# Altium footprint library 3D封装库.PcbLib: 716 footprints (part 15 of 45)
Each footprint in its own frame and in the unit in brackets; x right, y up, seen from the top. Pads: shape width x height; smd on the part's side, far side on the other; paste and mask are expansions set on the pad; w line width, h text height; cw(c..) or ccw(c..) is an arc to the next point about the centre after c.
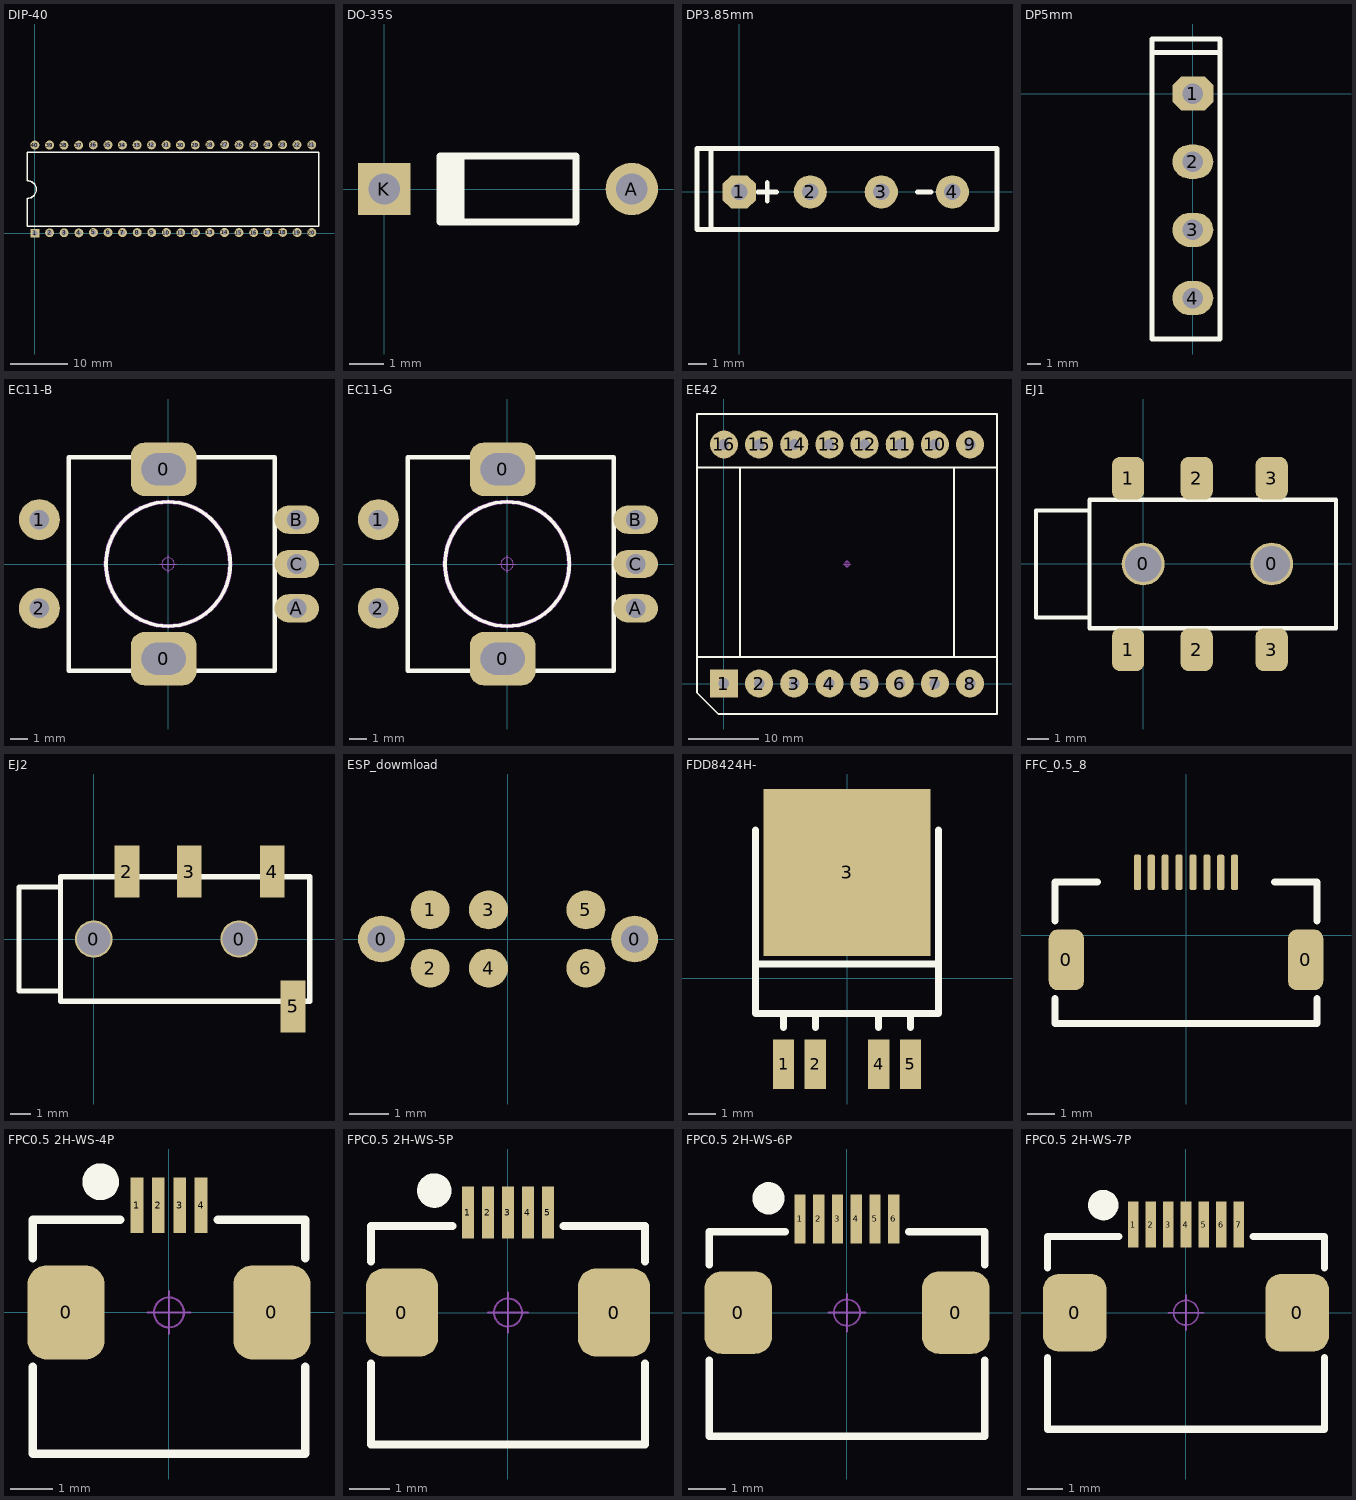
[diagram p14: the footprints below, top view; thin cyan lines are the x and y axes]

## DIP-40 [mil]
pads (40):
  rect 61x61 hole 35: 1(0,0)
  round 61 hole 35: 2(100.42,3.33) 3(199.58,3.33) 4(301.25,2.5) 5(400.83,5.42) 6(501.67,5.42) 7(600.42,4.58) 8(701.25,4.58) 9(800.83,5) 10(901.67,5) 11(1000.42,4.17) 12(1101.25,4.17) 13(1200,5.42) 14(1300.83,5.42) 15(1399.58,4.58) 16(1500.42,4.58) 17(1599.17,5.83) 18(1700,5.83) 19(1798.75,5) 20(1899.58,5) 21(1898.75,606.67) 22(1797.92,606.67) 23(1699.17,607.5) 24(1598.33,607.5) 25(1501.25,606.25) 26(1400.42,606.25) 27(1301.67,607.08) 28(1200.83,607.08) 29(1099.58,605.42) 30(998.75,605.42) 31(900,606.25) 32(799.17,606.25) 33(700.42,605.42) 34(599.58,605.42) 35(500.83,606.25) 36(400,606.25) 37(299.58,604.58) 38(198.75,604.58) 39(100,605.42) 40(-0.83,605.42)
Top Overlay:
  lines w10: -52.5,240.35 -52.5,49.58 1948.75,49.58 1948.75,557.5 -52.5,557.5 -52.5,359.6 cw(c-50,300) -50,240.35
3D body "DIP40.step": height 224.41, standoff -101.57, extent -90.1,-0.09 1974.86,609.75

## DO-35S [mm] "Diode, Axial; Body 3.8 x 1.9 mm (LxDia. max), Lead Dia. 0.53 mm (max)"
height 1.9
pads (2):
  round 1.5 hole 0.9: A(7.1,0)
  rect 1.5x1.5 hole 0.9: K(0,0)
Top Overlay:
  region: 2.3,0.95 1.5,0.95 1.5,-0.95 2.3,-0.95
  lines w0.2: 1.6,-0.95 5.5,-0.95 5.5,0.95 1.6,0.95

## DP3.85mm [mm]
pads (4):
  oct 1.8x1.8 hole 0.9: 1(0,0)
  round 1.8 hole 0.9: 2(3.85,0) 3(7.7,0) 4(11.55,0)
Top Overlay:
  lines w0.254: -1.524,-2.032 -1.524,2.348 ; 1.016,0 2.032,0 ; 1.524,-0.508 1.524,0.508 ; 9.652,0 10.414,0 ; -2.286,-2.032 13.97,-2.032 13.97,2.348 -2.286,2.348 -2.286,-2.032

## DP5mm [mm]
pads (4):
  oct 3x2.5 hole 1.5: 1(0,0)
  oval 3x2.5 hole 1.5: 2(0,-5) 3(0,-10) 4(0,-15)
Top Overlay:
  lines w0.381: -3,3 2,3 ; -3,-18 -3,4 2,4 2,-18 -3,-18

## EC11-B [mm] "数字开关编码器"
pads (7):
  rrect50% 3.7x3 hole 1.8 slot 2.5 at 0 deg: 0(-0.254,-5.334) 0(-0.254,5.334)
  round 2.3 hole 1.1: 1(-7.25,2.5) 2(-7.25,-2.5)
  oval 2.5x1.6 hole 1.1: A(7.25,-2.5) B(7.25,2.5) C(7.25,0)
Top Overlay:
  circle w0.203: c0,0 r3.5
  lines w0.254: -5.588,-6 -5.588,6 6,6 6,-6 -5.588,-6
Mechanical 15:
  circle w0.254: c0,0 r3.5
  circle w0.05: c0,0 r0.35
  lines w0.05: -0.5,0 0.5,0 ; 0,-0.5 0,0.5
3D body "CE11.STEP": height 22, standoff -3.5, extent -7.35,-6.237 7.45,6.237

## EC11-G [mm] "数字开关编码器"
pads (7):
  rrect50% 3.7x3 hole 1.8 slot 2.5 at 0 deg: 0(-0.254,-5.334) 0(-0.254,5.334)
  round 2.3 hole 1.1: 1(-7.25,2.5) 2(-7.25,-2.5)
  oval 2.5x1.6 hole 1.1: A(7.25,-2.5) B(7.25,2.5) C(7.25,0)
Top Overlay:
  circle w0.203: c0,0 r3.5
  lines w0.254: -5.588,-6 6,-6 6,6 -5.588,6 -5.588,-6
Mechanical 15:
  circle w0.05: c0,0 r0.35
  circle w0.254: c0,0 r3.5
  lines w0.05: -0.5,0 0.5,0 ; 0,-0.5 0,0.5
3D body "EC11-B.STEP": height 22, standoff -3.5, extent -7.404,-6.237 7.396,6.237

## EE42 [mm]
pads (16):
  rect 4x4 hole 1.5: 1(0,0)
  round 4 hole 1.5: 2(5,0) 3(10,0) 4(15,0) 5(20,0) 6(25,0) 7(30,0) 8(35,0) 9(35,34) 10(30,34) 11(25,34) 12(20,34) 13(15,34) 14(10,34) 15(5,34) 16(0,34)
Top Overlay:
  lines w0.254: -3.836,3.792 38.836,3.792 ; -3.836,30.716 38.836,30.716 ; 2.26,3.792 2.26,30.716 ; 32.74,3.792 32.74,30.716 ; -3.836,-1.288 -3.836,38.336 38.836,38.336 38.836,-4.336 -0.788,-4.336 -3.836,-1.288
Mechanical 15:
  circle w0.05: c17.5,17 r0.35
  lines w0.05: 17,17 18,17 ; 17.5,16.5 17.5,17.5
3D body "EE42-15 8+8.STEP": height 31.55, standoff -3.15, extent -3.6,-4.1 38.6,38.1

## EJ1 [mm]
pads (8):
  round 2 hole 1.7: 0(0,0) 0(6,0)
  rrect50% 1.5x2 smd: 1(-0.7,-4) 1(-0.7,4) 2(2.5,-4) 2(2.5,4) 3(6,-4) 3(6,4)
Top Overlay:
  lines w0.203: -2.5,-2.75 -2.5,2.75 ; -5,-2.5 -5,2.5 -2.5,2.5 -2.5,3 9,3 9,-3 -2.5,-3 -2.5,-2.5 -5,-2.5

## EJ2 [mm]
pads (6):
  round 1.8 hole 1.6: 0(0,0) 0(7,0)
  rect 1.2x2.5 smd: 2(1.6,3.25) 3(4.6,3.25) 4(8.6,3.25) 5(9.6,-3.25)
Top Overlay:
  lines w0.254: -1.6,-2.5 -3.6,-2.5 -3.6,2.5 -1.6,2.5 ; -1.6,-3 10.4,-3 10.4,3 -1.6,3 -1.6,-3

## ESP_dowmload [mm] "下载接口"
pads (8):
  round 1.2 hole 0.7 mask+0.05: 0(-3.25,0) 0(3.25,0)
  round 1 smd paste-1 mask+0.05: 1(-2,0.75) 2(-2,-0.75) 3(-0.5,0.75) 4(-0.5,-0.75) 5(2,0.75) 6(2,-0.75)
Mechanical 15:
  text "TXD" at -1.68,-2.97 h1
  text "5V0" at -0.184,-2.762 h1
  text "REST" at 2.32,-3.546 h1
  text "GPIO0" at 2.32,1.25 h1
  text "RXD" at -1.68,1.25 h1
  text "3V3" at -0.184,1.25 h1

## FDD8424H- [mil]
pads (5):
  rect 30x70 smd: 1(-90,-122.5) 2(-45,-122.5) 4(45,-122.5) 5(90,-122.5)
  rect 237x237 smd: 3(0,150)
Top Overlay:
  lines w10: -130,20 130,20 ; -130,210 -130,-50 130,-50 130,210 ; -90,-70 -90,-50 ; -45,-70 -45,-50 ; 45,-70 45,-50 ; 90,-70 90,-50

## FFC_0.5_8 [mil]
height 78.74
pads (10):
  rrect50% 50x86 smd: 0(-169.5,-35) 0(169.5,-35)
  rrect50% 10x50 smd: 1(-68.9,89) 2(-49.21,89) 3(-29.53,89) 4(-9.84,89) 5(9.84,89) 6(29.53,89) 7(49.21,89) 8(68.9,89)
Top Overlay:
  lines w10: -185.63,-125 -185.63,-90 ; -185.63,20 -185.63,75 -125.63,75 ; -185,-125 185,-125 ; 125.63,75 185.63,75 185.63,20 ; 185.63,-125 185.63,-90
3D body "fpc.step": height 81.71, standoff -1.16, extent -187,-123.51 187.01,86.56

## FPC0.5 2H-WS-4P [mm] "长：6.2mm，宽：5.2mm，高：2mm"
pads (6):
  rrect50% 1.8x2.2 smd: 0(-2.4,0) 0(2.4,0)
  rect 0.3x1.3 smd: 1(-0.75,2.497) 2(-0.25,2.497) 3(0.25,2.497) 4(0.75,2.497)
Top Overlay:
  circle w0.5: c-1.594,3.048 r0.18
  lines w0.2: -3.175,-1.27 -3.175,-3.302 3.175,-3.302 3.175,-1.27 ; -3.175,1.27 -3.175,2.159 -1.143,2.159 ; 1.143,2.159 3.175,2.159 3.175,1.27
Mechanical 15:
  circle w0.05: c0,0 r0.35
  lines w0.05: -0.5,0 0.5,0 ; 0,-0.5 0,0.5
3D body "FPC0.5 2H-S-W-4P.STEP": height 2, standoff -0.01, extent -3.1,-3.15 3.1,2.85

## FPC0.5 2H-WS-5P [mm] "长：6.7mm，宽：5.2mm，高：2mm"
pads (7):
  rrect50% 1.8x2.2 smd: 0(-2.65,0) 0(2.65,0)
  rect 0.3x1.3 smd: 1(-1,2.497) 2(-0.5,2.497) 3(0,2.497) 4(0.5,2.497) 5(1,2.497)
Top Overlay:
  circle w0.5: c-1.844,3.048 r0.18
  lines w0.2: -3.425,-1.27 -3.425,-3.302 3.425,-3.302 3.425,-1.27 ; -3.425,1.27 -3.425,2.159 -1.393,2.159 ; 1.393,2.159 3.425,2.159 3.425,1.27
Mechanical 15:
  circle w0.05: c0,0 r0.35
  lines w0.05: -0.5,0 0.5,0 ; 0,-0.5 0,0.5
3D body "FPC0.5 2H-S-W-5P.STEP": height 2, standoff -0.01, extent -3.35,-3.15 3.35,2.85

## FPC0.5 2H-WS-6P [mm] "长：7.2mm，宽：5.2mm，高：2mm"
pads (8):
  rrect50% 1.8x2.2 smd: 0(-2.9,0) 0(2.9,0)
  rect 0.3x1.3 smd: 1(-1.25,2.497) 2(-0.75,2.497) 3(-0.25,2.497) 4(0.25,2.497) 5(0.75,2.497) 6(1.25,2.497)
Top Overlay:
  circle w0.5: c-2.094,3.048 r0.18
  lines w0.2: -3.675,-1.27 -3.675,-3.302 3.675,-3.302 3.675,-1.27 ; -3.675,1.27 -3.675,2.159 -1.643,2.159 ; 1.643,2.159 3.675,2.159 3.675,1.27
Mechanical 15:
  circle w0.05: c0,0 r0.35
  lines w0.05: -0.5,0 0.5,0 ; 0,-0.5 0,0.5
3D body "FPC0.5 2H-S-W-6P.STEP": height 2, standoff -0.01, extent -3.6,-3.15 3.6,2.85

## FPC0.5 2H-WS-7P [mm] "长：7.7mm，宽：5.2mm，高：2mm"
pads (9):
  rrect50% 1.8x2.2 smd: 0(-3.15,0) 0(3.15,0)
  rect 0.3x1.3 smd: 1(-1.5,2.497) 2(-1,2.497) 3(-0.5,2.497) 4(0,2.497) 5(0.5,2.497) 6(1,2.497) 7(1.5,2.497)
Top Overlay:
  circle w0.5: c-2.344,3.048 r0.18
  lines w0.2: -3.925,-1.27 -3.925,-3.302 3.925,-3.302 3.925,-1.27 ; -3.925,1.27 -3.925,2.159 -1.893,2.159 ; 1.893,2.159 3.925,2.159 3.925,1.27
Mechanical 15:
  circle w0.05: c0,0 r0.35
  lines w0.05: -0.5,0 0.5,0 ; 0,-0.5 0,0.5
3D body "FPC0.5 2H-S-W-7P.STEP": height 2, standoff -0.01, extent -3.85,-3.15 3.85,2.85